# Altium footprint library OT Library.PcbLib: 396 footprints (part 10 of 25)
Each footprint in its own frame and in the unit in brackets; x right, y up, seen from the top. Pads: shape width x height; smd on the part's side, far side on the other; paste and mask are expansions set on the pad; w line width, h text height; cw(c..) or ccw(c..) is an arc to the next point about the centre after c.
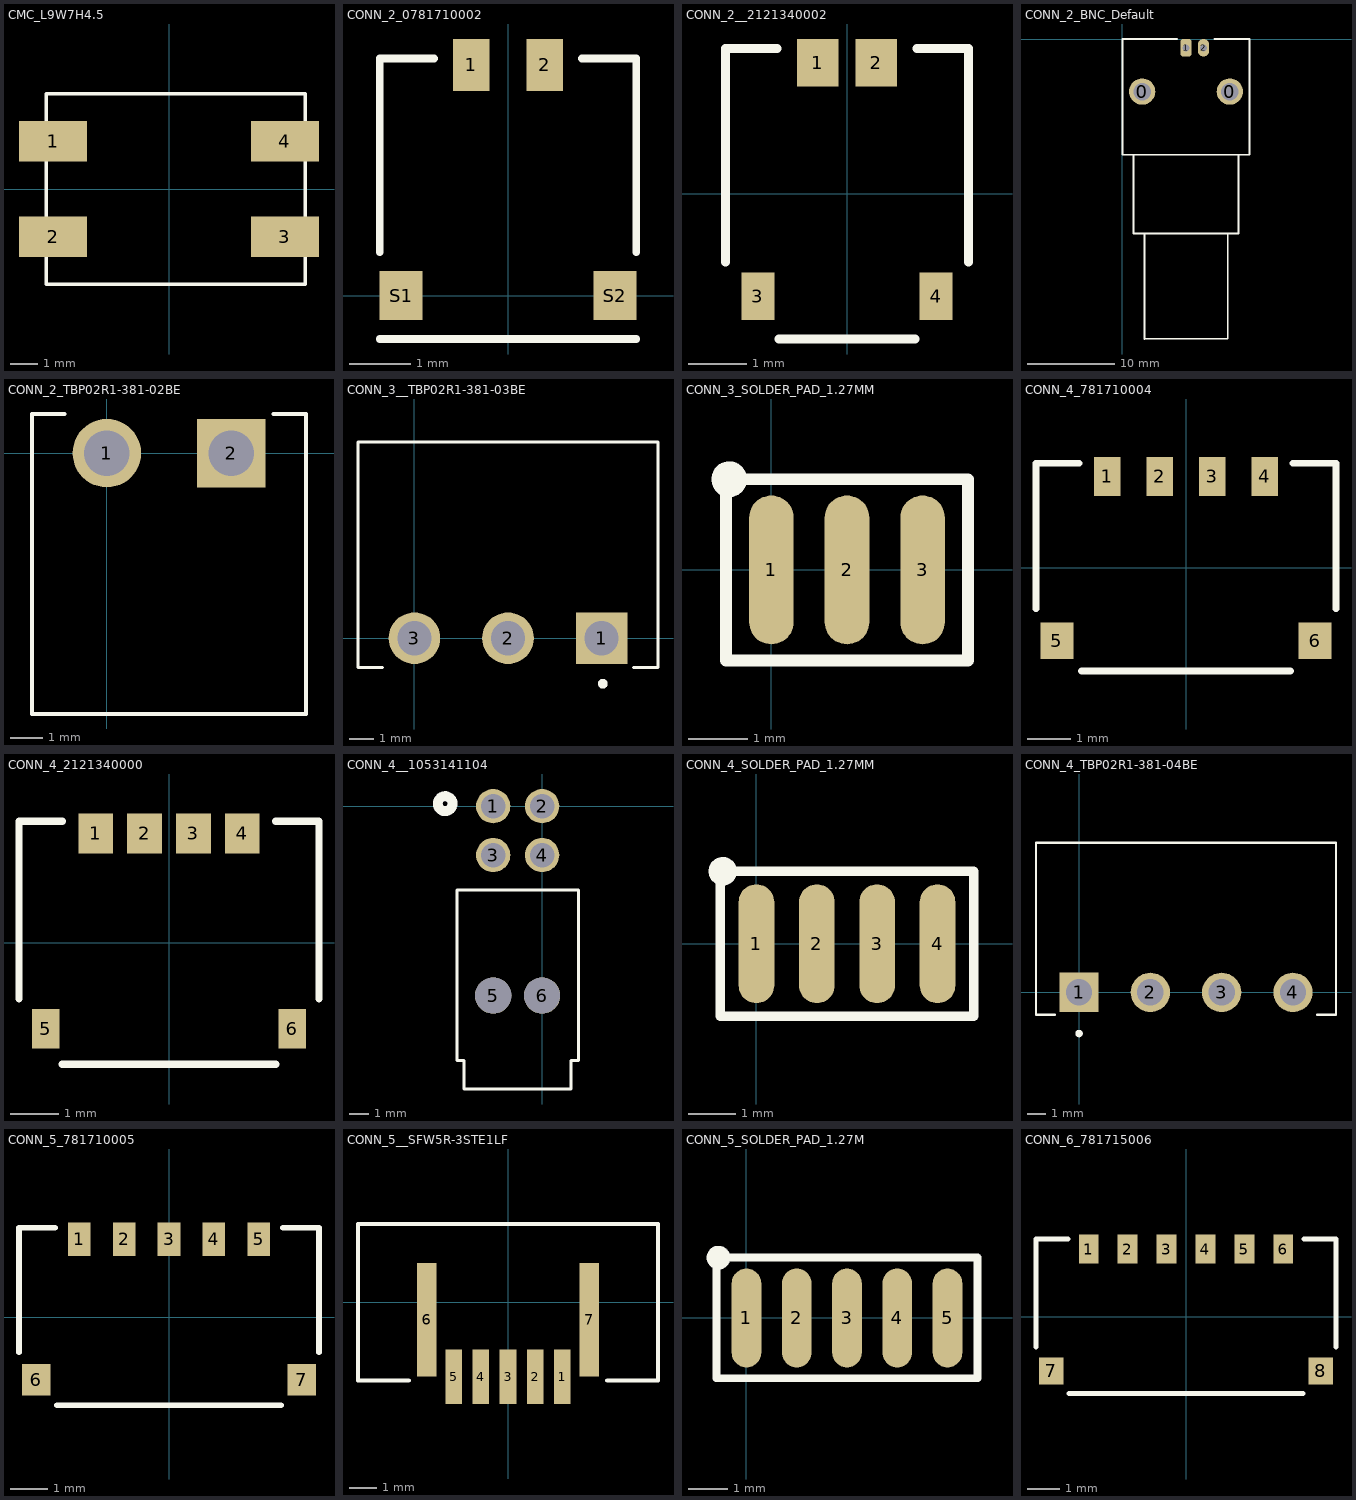
[diagram p9: the footprints below, top view; thin cyan lines are the x and y axes]

## CMC_L9W7H4.5 [mm] "0.354\" L x 0.276\" W (9.00mm x 7.00mm)"
height 4.5
pads (4):
  rect 2.5x1.5 smd: 1(-4.25,1.75) 2(-4.25,-1.75) 3(4.25,-1.75) 4(4.25,1.75)
Top Overlay:
  lines w0.127: -4.5,-3.5 5,-3.5 5,3.5 -4.5,3.5 -4.5,-3.5
3D body: height 4.33, standoff -0.03, extent -4.246,-3.571 4.754,3.429

## CONN_2_0781710002 [mm]
pads (4):
  rect 0.6x0.85 smd: 1(-0.6,3.775) 2(0.6,3.775)
  rect 0.7x0.8 smd: S1(-1.75,0) S2(1.75,0)
Top Overlay:
  lines w0.127: -2.1,-0.71 2.1,-0.71 ; -2.1,0.71 -2.1,3.88 -1.21,3.88 ; 1.21,3.88 2.1,3.88 2.1,0.71
3D body: height 1.2, standoff -0.25, extent -2.065,-0.718 2.135,3.812

## CONN_2__2121340002 [mil]
pads (4):
  rect 28x32 smd: 1(-19.68,88.28) 2(19.68,88.28)
  rect 22x32 smd: 3(-60.04,-69.2) 4(60.04,-69.2)
Top Overlay:
  lines w6: -82,-46 -82,98 -47,98 ; -46,-98 46,-98 ; 47,98 82,98 82,-46
3D body: height 46.46, standoff -0.79, extent -76.46,-94.97 77.09,93.62

## CONN_2_BNC_Default [mm]
pads (4):
  round 3 hole 2: 0(2.25,-6) 0(12.25,-6)
  rrect50% 1.3x2 hole 0.8: 1(7.25,-1)
  oval 1.3x2 hole 0.8: 2(9.25,-1)
Top Overlay:
  lines w0.2: 1.25,-13.2 1.25,-22.2 13.233,-22.2 ; 2.514,-34.225 2.514,-22.225 ; 2.514,-34.2 12.014,-34.2 12.014,-22.2 ; 6.223,0 0,0 0,-13.2 14.5,-13.2 14.5,0 10.465,0 ; 13.25,-22.2 13.25,-13.208
3D body: height 11.55, standoff -5.2, extent 0,-34.2 14.5,0

## CONN_2_TBP02R1-381-02BE [mm]
pads (2):
  round 2.1 hole 1.4: 1(0,0)
  rect 2.1x2.1 / inner round 2.1 / far side rect 2.1x2.1 hole 1.4: 2(3.81,0)
Top Overlay:
  lines w0.127: -1.3,1.2 -2.3,1.2 -2.3,-8 6.11,-8 6.11,1.2 5.11,1.2
3D body: height 7.2, standoff -3.5, extent -2.427,-8.057 5.983,1.143

## CONN_3__TBP02R1-381-03BE [mm]
pads (3):
  rect 2.1x2.1 hole 1.4: 1(7.62,0)
  round 2.1 hole 1.4: 2(3.81,0) 3(0,0)
Top Overlay:
  circle w0.2: c7.671,-1.854 r0.1
  lines w0.127: -1.3,-1.2 -2.3,-1.2 -2.3,8 9.92,8 9.92,-1.2 8.92,-1.2
3D body: height 7.3, standoff -3.4, extent -2.263,-1.095 9.957,8.105

## CONN_3_SOLDER_PAD_1.27MM [mm] "2.5MMX0.75MM"
pads (3):
  oval 0.75x2.5 smd: 1(0,0) 2(1.27,0) 3(2.54,0)
Top Overlay:
  circle w0.2: c-0.708,1.524 r0.2
  lines w0.2: -0.762,-1.524 3.302,-1.524 3.302,1.524 -0.762,1.524 -0.762,-1.524

## CONN_4_781710004 [mil]
pads (6):
  rect 24x35 smd: 1(-70.87,82) 2(-23.62,82) 3(23.62,82) 4(70.87,82)
  rect 30x33 smd: 5(-116.14,-65.87) 6(116.14,-65.87)
Top Overlay:
  lines w6: -135,-37 -135,94 -96,94 ; -94,-93 94,-93 ; 96,94 135,94 135,-37
3D body: height 47.24, standoff -9.84, extent -130.78,-88.26 129.06,90.08

## CONN_4_2121340000 [mil]
pads (6):
  rect 28x32 smd: 1(-59.06,88.28) 2(-19.68,88.28) 3(19.68,88.28) 4(59.06,88.28)
  rect 22x32 smd: 5(-99.41,-69.2) 6(99.41,-69.2)
Top Overlay:
  lines w6: -121,-45 -121,98 -86,98 ; -86,-98 86,-98 ; 86,98 121,98 121,-45
3D body: height 46.46, standoff -0.79, extent -116.2,-95.97 116.09,92.62

## CONN_4__1053141104 [mil]
pads (6):
  round 69 / inner round 60 / far side round 69 hole 49 paste-34.5 mask+0: 1(-98.43,0) 2(0,0) 3(-98.43,-98.43) 4(0,-98.43)
  round 73 / inner round 60 / far side round 73 hole 73 unplated paste+0 mask+0: 5(-98.43,-381.1) 6(0,-381.1)
Top Overlay:
  circle w20: c-195,5 r15
  lines w6: -171.21,-512.02 -156.71,-512.02 -156.71,-569.02 58.29,-569.02 58.29,-512.02 72.79,-512.02 72.79,-169.02 -171.21,-169.02 -171.21,-512.02
3D body: height 362.2, standoff -123.62, extent -166.92,-564.01 66.93,13.06

## CONN_4_SOLDER_PAD_1.27MM [mm] "2.5MMX0.75MM"
pads (4):
  oval 0.75x2.5 smd: 1(0,0) 2(1.27,0) 3(2.54,0) 4(3.81,0)
Top Overlay:
  circle w0.2: c-0.708,1.524 r0.2
  lines w0.2: -0.762,-1.524 4.572,-1.524 4.572,1.524 -0.762,1.524 -0.762,-1.524

## CONN_4_TBP02R1-381-04BE [mm]
pads (4):
  rect 2.1x2.1 / inner round 2.1 / far side rect 2.1x2.1 hole 1.4: 1(0,0)
  round 2.1 hole 1.4: 2(3.81,0) 3(7.62,0) 4(11.43,0)
Top Overlay:
  circle w0.2: c0,-2.2 r0.1
  lines w0.127: -1.3,-1.2 -2.3,-1.2 -2.3,8 13.73,8 13.73,-1.2 12.73,-1.2
3D body: height 7.2, standoff -3.5, extent -2.249,-1.224 13.781,7.976

## CONN_5_781710005 [mil]
pads (7):
  rect 24x35 smd: 1(-94.49,82) 2(-47.24,82) 3(0,82) 4(47.24,82) 5(94.49,82)
  rect 30x33 smd: 6(-139.76,-65.87) 7(139.76,-65.87)
Top Overlay:
  lines w6: -158,-37 -158,94 -120,94 ; -118,-93 118,-93 ; 120,94 158,94 158,-37
3D body: height 47.24, standoff -9.84, extent -153.03,-88.26 154.06,90.08

## CONN_5__SFW5R-3STE1LF [mil]
pads (7):
  rect 24x79 smd: 1(78.74,-108.5) 2(39.37,-108.5) 3(0,-108.5) 4(-39.37,-108.5) 5(-78.74,-108.5)
  rect 28x165 smd: 6(-118,-25.5) 7(118,-25.5)
Top Overlay:
  lines w6: -143.89,-113.5 -217.5,-113.5 -217.5,113.5 217.5,113.5 217.5,-113.5 143.89,-113.5
3D body: height 106.3, standoff 0, extent -212.6,-142.9 212.6,113

## CONN_5_SOLDER_PAD_1.27M [mm] "2.5MMX0.75MM"
pads (5):
  oval 0.75x2.5 smd: 1(0,0) 2(1.27,0) 3(2.54,0) 4(3.81,0) 5(5.08,0)
Top Overlay:
  circle w0.2: c-0.708,1.524 r0.2
  lines w0.2: -0.762,-1.524 -0.762,1.524 5.842,1.524 5.842,-1.524 -0.762,-1.524

## CONN_6_781715006 [mil]
pads (8):
  rect 24x35 smd: 1(-118.11,82) 2(-70.87,82) 3(-23.62,82) 4(23.62,82) 5(70.87,82) 6(118.11,82)
  rect 30x33 smd: 7(-163.5,-65.87) 8(163.5,-65.87)
Top Overlay:
  lines w6: -182,-37 -182,94 -143,94 ; -142,-93 142,-93 ; 143,94 182,94 182,-37
3D body: height 47.24, standoff -9.84, extent -177.17,-90 177.17,88.35